# Altium footprint library Package_DFN_QFN.PcbLib: 557 footprints (part 2 of 35)
Each footprint in its own frame and in the unit in brackets; x right, y up, seen from the top. Pads: shape width x height; smd on the part's side, far side on the other; paste and mask are expansions set on the pad; w line width, h text height; cw(c..) or ccw(c..) is an arc to the next point about the centre after c.
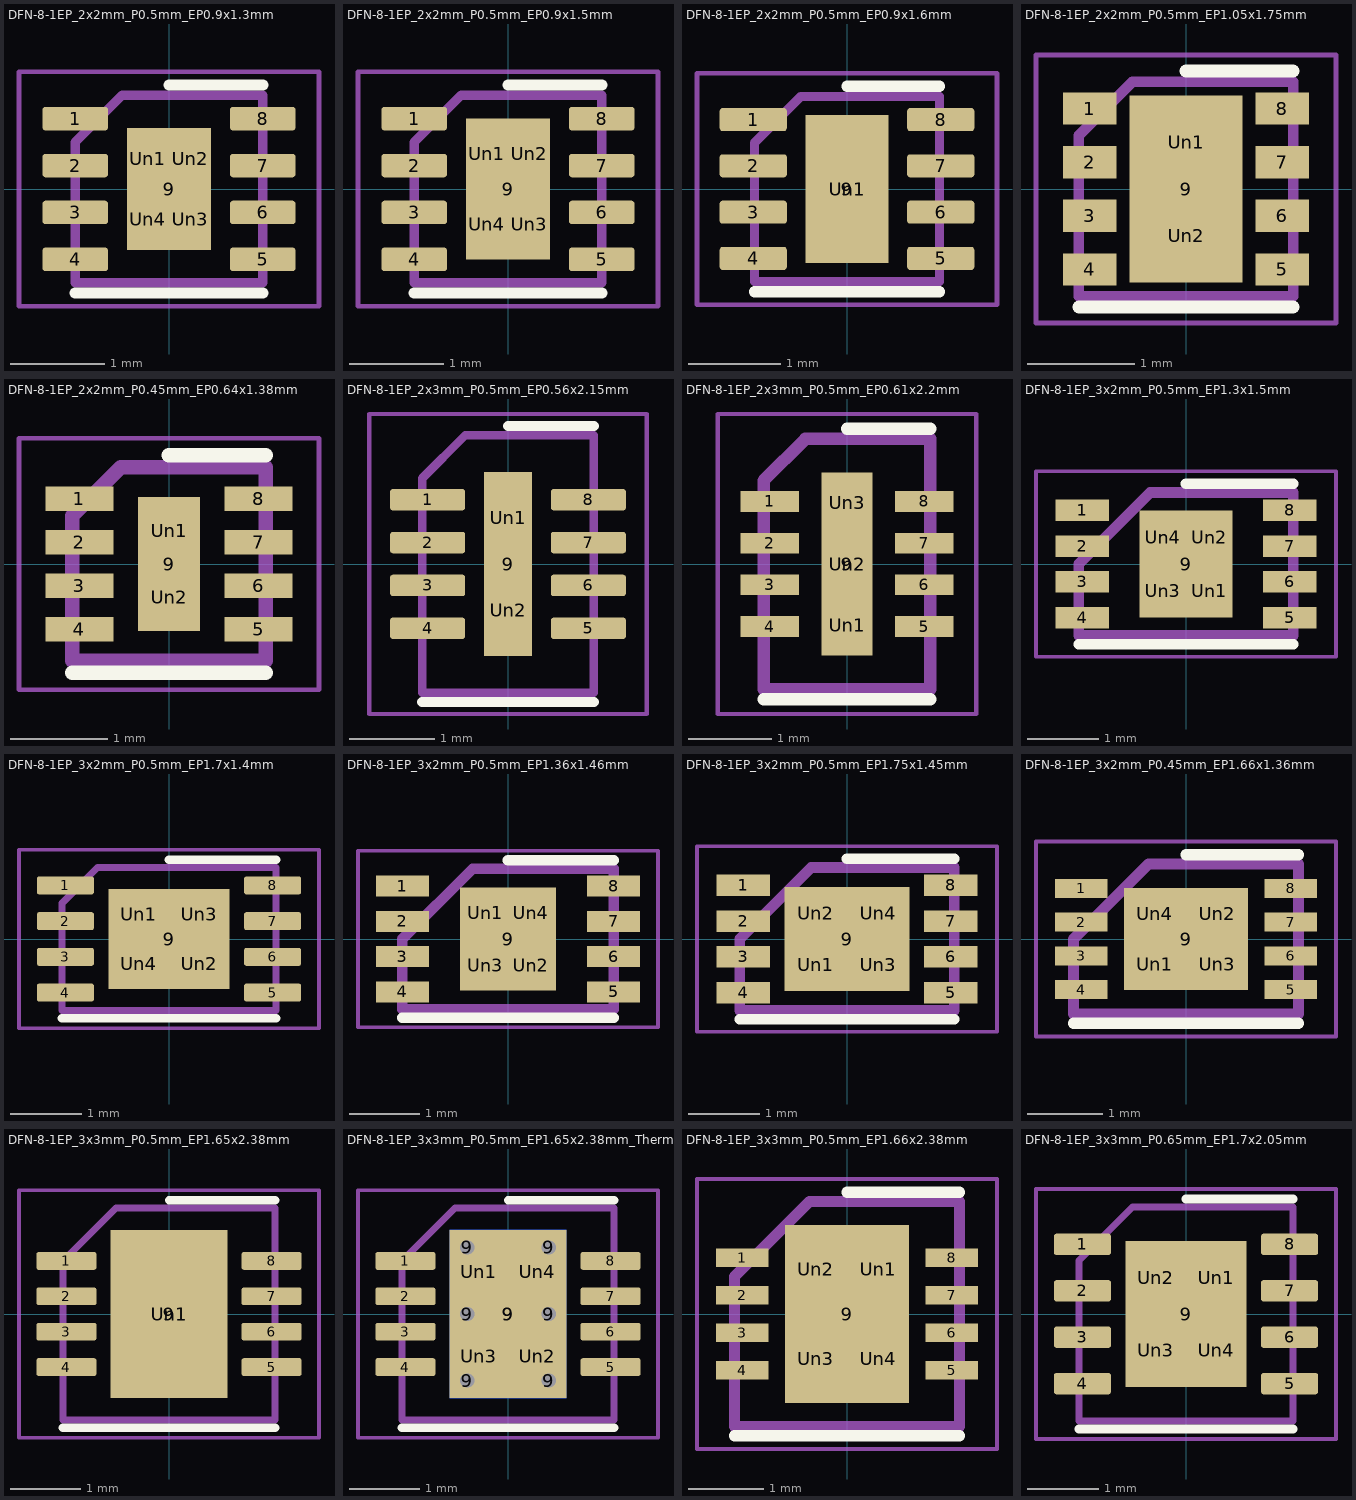
[diagram p1: the footprints below, top view; thin cyan lines are the x and y axes]

## DFN-8-1EP_2x2mm_P0.5mm_EP0.9x1.3mm [mm]
pads (13):
  rrect25% 0.7x0.25 smd: 1(-1,0.75) 2(-1,0.25) 3(-1,-0.25) 4(-1,-0.75) 5(1,-0.75) 6(1,-0.25) 7(1,0.25) 8(1,0.75)
  rect 0.9x1.3 smd: 9(0,0)
  rrect25% 0.36x0.52 on Top Paste: Un1(-0.225,0.325) Un2(0.225,0.325) Un3(0.225,-0.325) Un4(-0.225,-0.325)
F.SilkS:
  lines w0.12: -1,-1.11 1,-1.11 ; 0,1.11 1,1.11
F.CrtYd:
  lines w0.05: -1.6,-1.25 1.6,-1.25 1.6,1.25 -1.6,1.25 -1.6,-1.25
F.Fab:
  lines w0.1: -1,-1 1,-1 1,1 -0.5,1 -1,0.5 -1,-1
  text "'.Designator'" at -2.028,-0.425 h0.5

## DFN-8-1EP_2x2mm_P0.5mm_EP0.9x1.5mm [mm]
pads (13):
  rrect25% 0.7x0.25 smd: 1(-1,0.75) 2(-1,0.25) 3(-1,-0.25) 4(-1,-0.75) 5(1,-0.75) 6(1,-0.25) 7(1,0.25) 8(1,0.75)
  rect 0.9x1.5 smd: 9(0,0)
  rrect25% 0.36x0.6 on Top Paste: Un1(-0.225,0.375) Un2(0.225,0.375) Un3(0.225,-0.375) Un4(-0.225,-0.375)
F.SilkS:
  lines w0.12: -1,-1.11 1,-1.11 ; 0,1.11 1,1.11
F.CrtYd:
  lines w0.05: -1.6,-1.25 -1.6,1.25 1.6,1.25 1.6,-1.25 -1.6,-1.25
F.Fab:
  lines w0.1: -1,-1 -1,0.5 -0.5,1 1,1 1,-1 -1,-1
  text "'.Designator'" at -2.028,-0.425 h0.5

## DFN-8-1EP_2x2mm_P0.5mm_EP0.9x1.6mm [mm]
pads (10):
  rrect25% 0.725x0.25 smd: 1(-1.012,0.75) 2(-1.012,0.25) 3(-1.012,-0.25) 4(-1.012,-0.75) 5(1.012,-0.75) 6(1.012,-0.25) 7(1.012,0.25) 8(1.012,0.75)
  rect 0.9x1.6 smd: 9(0,0)
  rrect25% 0.73x1.29 on Top Paste: Un1(0,0)
F.SilkS:
  lines w0.12: -1,-1.11 1,-1.11 ; 0,1.11 1,1.11
F.CrtYd:
  lines w0.05: -1.62,-1.25 -1.62,1.25 1.62,1.25 1.62,-1.25 -1.62,-1.25
F.Fab:
  lines w0.1: -1,-1 -1,0.5 -0.5,1 1,1 1,-1 -1,-1
  text "'.Designator'" at -2.028,-0.425 h0.5

## DFN-8-1EP_2x2mm_P0.5mm_EP1.05x1.75mm [mm]
pads (11):
  rect 0.5x0.3 smd: 1(-0.9,0.75) 2(-0.9,0.25) 3(-0.9,-0.25) 4(-0.9,-0.75) 5(0.9,-0.75) 6(0.9,-0.25) 7(0.9,0.25) 8(0.9,0.75)
  rect 1.05x1.75 smd: 9(0,0)
  rect 0.85x0.65 on Top Paste: Un1(0,0.437) Un2(0,-0.437)
F.SilkS:
  lines w0.12: -1,-1.1 1,-1.1 ; 0,1.1 1,1.1
F.CrtYd:
  lines w0.05: -1.4,-1.25 -1.4,1.25 1.4,1.25 1.4,-1.25 -1.4,-1.25
F.Fab:
  lines w0.1: -1,-1 1,-1 1,1 -0.5,1 -1,0.5 -1,-1
  text "'.Designator'" at -1.619,-0.336 h0.4

## DFN-8-1EP_2x2mm_P0.45mm_EP0.64x1.38mm [mm]
pads (11):
  rect 0.7x0.25 smd: 1(-0.925,0.675) 2(-0.925,0.225) 3(-0.925,-0.225) 4(-0.925,-0.675) 5(0.925,-0.675) 6(0.925,-0.225) 7(0.925,0.225) 8(0.925,0.675)
  rect 0.64x1.38 smd: 9(0,0)
  rect 0.53x0.54 on Top Paste: Un1(0,0.345) Un2(0,-0.345)
F.SilkS:
  lines w0.15: -1,-1.125 1,-1.125 ; 0,1.125 1,1.125
F.CrtYd:
  lines w0.05: -1.55,-1.3 1.55,-1.3 1.55,1.3 -1.55,1.3 -1.55,-1.3
F.Fab:
  lines w0.15: -1,-1 -1,0.5 -0.5,1 1,1 1,-1 -1,-1
  text "'.Designator'" at -2.023,-0.42 h0.5

## DFN-8-1EP_2x3mm_P0.5mm_EP0.56x2.15mm [mm]
pads (11):
  rrect25% 0.875x0.25 smd: 1(-0.937,0.75) 2(-0.937,0.25) 3(-0.937,-0.25) 4(-0.937,-0.75) 5(0.937,-0.75) 6(0.937,-0.25) 7(0.937,0.25) 8(0.937,0.75)
  rect 0.56x2.15 smd: 9(0,0)
  rrect25% 0.45x0.87 on Top Paste: Un1(0,0.54) Un2(0,-0.54)
F.SilkS:
  lines w0.12: -1,-1.61 1,-1.61 ; 0,1.61 1,1.61
F.CrtYd:
  lines w0.05: -1.62,-1.75 1.62,-1.75 1.62,1.75 -1.62,1.75 -1.62,-1.75
F.Fab:
  lines w0.1: -1,-1.5 1,-1.5 1,1.5 -0.5,1.5 -1,1 -1,-1.5
  text "'.Designator'" at -2.028,-0.425 h0.5

## DFN-8-1EP_2x3mm_P0.5mm_EP0.61x2.2mm [mm]
pads (12):
  rect 0.7x0.25 smd: 1(-0.925,0.75) 2(-0.925,0.25) 3(-0.925,-0.25) 4(-0.925,-0.75) 5(0.925,-0.75) 6(0.925,-0.25) 7(0.925,0.25) 8(0.925,0.75)
  rect 0.61x2.2 smd: 9(0,0)
  rect 0.5x0.59 on Top Paste: Un1(0,-0.734) Un2(0,0) Un3(0,0.734)
F.SilkS:
  lines w0.15: -1,-1.625 1,-1.625 ; 0,1.625 1,1.625
F.CrtYd:
  lines w0.05: -1.55,-1.8 1.55,-1.8 1.55,1.8 -1.55,1.8 -1.55,-1.8
F.Fab:
  lines w0.15: -1,-1.5 1,-1.5 1,1.5 -0.5,1.5 -1,1 -1,-1.5
  text "'.Designator'" at 0.42,-2.023 h0.5

## DFN-8-1EP_3x2mm_P0.5mm_EP1.3x1.5mm [mm]
pads (13):
  rect 0.75x0.3 smd: 1(-1.45,0.75) 2(-1.45,0.25) 3(-1.45,-0.25) 4(-1.45,-0.75) 5(1.45,-0.75) 6(1.45,-0.25) 7(1.45,0.25) 8(1.45,0.75)
  rect 1.3x1.5 smd: 9(0,0)
  rect 0.5x0.6 on Top Paste: Un1(0.325,-0.375) Un2(0.325,0.375) Un3(-0.325,-0.375) Un4(-0.325,0.375)
F.SilkS:
  lines w0.15: -1.5,-1.125 1.5,-1.125 ; 0,1.125 1.5,1.125
F.CrtYd:
  lines w0.05: -2.1,-1.3 2.1,-1.3 2.1,1.3 -2.1,1.3 -2.1,-1.3
F.Fab:
  lines w0.15: -1.5,-1 -1.5,0 -0.5,1 1.5,1 1.5,-1 -1.5,-1
  text "'.Designator'" at -2.833,-0.588 h0.7

## DFN-8-1EP_3x2mm_P0.5mm_EP1.7x1.4mm [mm]
pads (13):
  rrect25% 0.8x0.25 smd: 1(-1.45,0.75) 2(-1.45,0.25) 3(-1.45,-0.25) 4(-1.45,-0.75) 5(1.45,-0.75) 6(1.45,-0.25) 7(1.45,0.25) 8(1.45,0.75)
  rect 1.7x1.4 smd: 9(0,0)
  rrect25% 0.69x0.56 on Top Paste: Un1(-0.425,0.35) Un2(0.425,-0.35) Un3(0.425,0.35) Un4(-0.425,-0.35)
F.SilkS:
  lines w0.12: -1.5,-1.11 1.5,-1.11 ; 0,1.11 1.5,1.11
F.CrtYd:
  lines w0.05: -2.1,-1.25 -2.1,1.25 2.1,1.25 2.1,-1.25 -2.1,-1.25
F.Fab:
  lines w0.1: -1.5,-1 1.5,-1 1.5,1 -1,1 -1.5,0.5 -1.5,-1
  text "'.Designator'" at -3.033,-0.628 h0.75

## DFN-8-1EP_3x2mm_P0.5mm_EP1.36x1.46mm [mm]
pads (13):
  rect 0.75x0.3 smd: 1(-1.5,0.75) 2(-1.5,0.25) 3(-1.5,-0.25) 4(-1.5,-0.75) 5(1.5,-0.75) 6(1.5,-0.25) 7(1.5,0.25) 8(1.5,0.75)
  rect 1.36x1.46 smd: 9(0,0)
  rect 0.5x0.6 on Top Paste: Un1(-0.325,0.375) Un2(0.325,-0.375) Un3(-0.325,-0.375) Un4(0.325,0.375)
F.SilkS:
  lines w0.15: -1.5,-1.12 1.5,-1.12 ; 0,1.12 1.5,1.12
F.CrtYd:
  lines w0.05: -2.13,-1.25 2.13,-1.25 2.13,1.25 -2.13,1.25 -2.13,-1.25
F.Fab:
  lines w0.15: -1.5,-1 -1.5,0 -0.5,1 1.5,1 1.5,-1 -1.5,-1
  text "'.Designator'" at -2.833,-0.588 h0.7

## DFN-8-1EP_3x2mm_P0.5mm_EP1.75x1.45mm [mm]
pads (13):
  rect 0.75x0.3 smd: 1(-1.45,0.75) 2(-1.45,0.25) 3(-1.45,-0.25) 4(-1.45,-0.75) 5(1.45,-0.75) 6(1.45,-0.25) 7(1.45,0.25) 8(1.45,0.75)
  rect 1.75x1.45 smd: 9(0,0)
  rect 0.71x0.58 on Top Paste: Un1(-0.437,-0.363) Un2(-0.437,0.363) Un3(0.437,-0.363) Un4(0.437,0.363)
F.SilkS:
  lines w0.15: -1.5,-1.125 1.5,-1.125 ; 0,1.125 1.5,1.125
F.CrtYd:
  lines w0.05: -2.1,-1.3 -2.1,1.3 2.1,1.3 2.1,-1.3 -2.1,-1.3
F.Fab:
  lines w0.15: -1.5,-1 -1.5,0 -0.5,1 1.5,1 1.5,-1 -1.5,-1
  text "'.Designator'" at -2.833,-0.588 h0.7

## DFN-8-1EP_3x2mm_P0.45mm_EP1.66x1.36mm [mm]
pads (13):
  rect 0.7x0.25 smd: 1(-1.4,0.675) 2(-1.4,0.225) 3(-1.4,-0.225) 4(-1.4,-0.675) 5(1.4,-0.675) 6(1.4,-0.225) 7(1.4,0.225) 8(1.4,0.675)
  rect 1.66x1.36 smd: 9(0,0)
  rect 0.66x0.55 on Top Paste: Un1(-0.415,-0.34) Un2(0.415,0.34) Un3(0.415,-0.34) Un4(-0.415,0.34)
F.SilkS:
  lines w0.15: -1.5,-1.125 1.5,-1.125 ; 0,1.125 1.5,1.125
F.CrtYd:
  lines w0.05: -2,-1.3 2,-1.3 2,1.3 -2,1.3 -2,-1.3
F.Fab:
  lines w0.15: -1.5,-1 -1.5,0 -0.5,1 1.5,1 1.5,-1 -1.5,-1
  text "'.Designator'" at -2.833,-0.588 h0.7

## DFN-8-1EP_3x3mm_P0.5mm_EP1.65x2.38mm [mm]
pads (10):
  rrect25% 0.85x0.25 smd: 1(-1.45,0.75) 2(-1.45,0.25) 3(-1.45,-0.25) 4(-1.45,-0.75) 5(1.45,-0.75) 6(1.45,-0.25) 7(1.45,0.25) 8(1.45,0.75)
  rect 1.65x2.38 smd: 9(0,0)
  rrect19% 1.33x1.92 on Top Paste: Un1(0,0)
F.SilkS:
  lines w0.12: -1.5,-1.61 1.5,-1.61 ; 0,1.61 1.5,1.61
F.CrtYd:
  lines w0.05: -2.12,-1.75 -2.12,1.75 2.12,1.75 2.12,-1.75 -2.12,-1.75
F.Fab:
  lines w0.1: -1.5,-1.5 -1.5,0.75 -0.75,1.5 1.5,1.5 1.5,-1.5 -1.5,-1.5
  text "'.Designator'" at -3.033,-0.628 h0.75

## DFN-8-1EP_3x3mm_P0.5mm_EP1.65x2.38mm_ThermalVias [mm]
pads (20):
  rrect25% 0.85x0.25 smd: 1(-1.45,0.75) 2(-1.45,0.25) 3(-1.45,-0.25) 4(-1.45,-0.75) 5(1.45,-0.75) 6(1.45,-0.25) 7(1.45,0.25) 8(1.45,0.75)
  round 0.5 hole 0.2: 9(-0.575,-0.94) 9(-0.575,0) 9(-0.575,0.94) 9(0.575,-0.94) 9(0.575,0) 9(0.575,0.94)
  rect 1.65x2.38 smd: 9(0,0)
  rect 1.65x2.38 smd far side: 9(0,0)
  rrect25% 0.67x0.96 on Top Paste: Un1(-0.41,0.595) Un2(0.41,-0.595) Un3(-0.41,-0.595) Un4(0.41,0.595)
F.SilkS:
  lines w0.12: -1.5,-1.61 1.5,-1.61 ; 0,1.61 1.5,1.61
F.CrtYd:
  lines w0.05: -2.12,-1.75 -2.12,1.75 2.12,1.75 2.12,-1.75 -2.12,-1.75
F.Fab:
  lines w0.1: -1.5,-1.5 1.5,-1.5 1.5,1.5 -0.75,1.5 -1.5,0.75 -1.5,-1.5
  text "'.Designator'" at -3.033,-0.628 h0.75

## DFN-8-1EP_3x3mm_P0.5mm_EP1.66x2.38mm [mm]
pads (13):
  rect 0.7x0.25 smd: 1(-1.4,0.75) 2(-1.4,0.25) 3(-1.4,-0.25) 4(-1.4,-0.75) 5(1.4,-0.75) 6(1.4,-0.25) 7(1.4,0.25) 8(1.4,0.75)
  rect 1.66x2.38 smd: 9(0,0)
  rect 0.64x1 on Top Paste: Un1(0.415,0.595) Un2(-0.415,0.595) Un3(-0.415,-0.595) Un4(0.415,-0.595)
F.SilkS:
  lines w0.15: -1.5,-1.625 1.5,-1.625 ; 0,1.625 1.5,1.625
F.CrtYd:
  lines w0.05: -2,-1.8 -2,1.8 2,1.8 2,-1.8 -2,-1.8
F.Fab:
  lines w0.15: -1.5,-1.5 -1.5,0.5 -0.5,1.5 1.5,1.5 1.5,-1.5 -1.5,-1.5
  text "'.Designator'" at -2.833,-0.588 h0.7

## DFN-8-1EP_3x3mm_P0.65mm_EP1.7x2.05mm [mm]
pads (13):
  rrect25% 0.8x0.3 smd: 1(-1.45,0.975) 2(-1.45,0.325) 3(-1.45,-0.325) 4(-1.45,-0.975) 5(1.45,-0.975) 6(1.45,-0.325) 7(1.45,0.325) 8(1.45,0.975)
  rect 1.7x2.05 smd: 9(0,0)
  rrect25% 0.69x0.83 on Top Paste: Un1(0.425,0.51) Un2(-0.425,0.51) Un3(-0.425,-0.51) Un4(0.425,-0.51)
F.SilkS:
  lines w0.12: -1.5,-1.61 1.5,-1.61 ; 0,1.61 1.5,1.61
F.CrtYd:
  lines w0.05: -2.1,-1.75 2.1,-1.75 2.1,1.75 -2.1,1.75 -2.1,-1.75
F.Fab:
  lines w0.1: -1.5,-1.5 1.5,-1.5 1.5,1.5 -0.75,1.5 -1.5,0.75 -1.5,-1.5
  text "'.Designator'" at -3.033,-0.628 h0.75